# Altium footprint library ref-packages-longpad.PCBLIB: 1527 footprints (part 74 of 103) (continued)
## SQFP-R-28X40-440 [mm] (continued)
Top Overlay:
  circle w0.254: c-17.75,-12 r0.75
  lines w0.203: -19.57,-13.56 19.56,-13.56 19.56,13.56 -19.57,13.56 -19.57,-13.56
Mechanical 16:
  drawing of 444 lines, arcs and shapes, not listed
Mechanical 27:
  lines w0.2: -21.9,-16.4 -21.9,16.4 21.9,16.4 21.9,-16.4 -21.9,-16.4

## SQFP-R-FP05X07-32 [mil]
pads (32):
  rect 11.81x62.99 smd: 1(-88.58,-122.05) 2(-68.9,-122.05) 3(-49.21,-122.05) 4(-29.53,-122.05) 5(-9.84,-122.05) 6(9.84,-122.05) 7(29.53,-122.05) 8(49.21,-122.05) 9(68.9,-122.05) 10(88.58,-122.05) 17(88.58,122.05) 18(68.9,122.05) 19(49.21,122.05) 20(29.53,122.05) 21(9.84,122.05) 22(-9.84,122.05) 23(-29.53,122.05) 24(-49.21,122.05) 25(-68.9,122.05) 26(-88.58,122.05)
  rect 62.99x11.81 smd: 11(161.42,-49.21) 12(161.42,-29.53) 13(161.42,-9.84) 14(161.42,9.84) 15(161.42,29.53) 16(161.42,49.21) 27(-161.42,49.21) 28(-161.42,29.53) 29(-161.42,9.84) 30(-161.42,-9.84) 31(-161.42,-29.53) 32(-161.42,-49.21)
Top Overlay:
  circle w10: c-74.8,-39.37 r29.52
  lines w8: -120.87,-81.1 120.47,-81.1 120.47,81.1 -120.87,81.1 -120.87,-81.1
Mechanical 16:
  rectangle: -94.49,-141.73 -82.68,-96.46
  rectangle: 133.86,-55.12 181.1,-43.31
  rectangle: -74.8,-141.73 -62.99,-96.46
  rectangle: -55.12,-141.73 -43.31,-96.46
  rectangle: -35.43,-141.73 -23.62,-96.46
  rectangle: -15.75,-141.73 -3.94,-96.46
  rectangle: 3.94,-141.73 15.75,-96.46
  rectangle: 23.62,-141.73 35.43,-96.46
  rectangle: 43.31,-141.73 55.12,-96.46
  rectangle: 62.99,-141.73 74.8,-96.46
  rectangle: 82.68,-141.73 94.49,-96.46
  rectangle: 133.86,-35.43 181.1,-23.62
  rectangle: 133.86,-15.75 181.1,-3.94
  rectangle: 133.86,3.94 181.1,15.75
  rectangle: 133.86,23.62 181.1,35.43
  rectangle: 133.86,43.31 181.1,55.12
  rectangle: 82.68,96.46 94.49,141.73
  rectangle: 62.99,96.46 74.8,141.73
  rectangle: 43.31,96.46 55.12,141.73
  rectangle: 23.62,96.46 35.43,141.73
  rectangle: 3.94,96.46 15.75,141.73
  rectangle: -15.75,96.46 -3.94,141.73
  rectangle: -35.43,96.46 -23.62,141.73
  rectangle: -55.12,96.46 -43.31,141.73
  rectangle: -74.8,96.46 -62.99,141.73
  rectangle: -94.49,96.46 -82.68,141.73
  rectangle: -181.1,43.31 -133.86,55.12
  rectangle: -181.1,23.62 -133.86,35.43
  rectangle: -181.1,3.94 -133.86,15.75
  rectangle: -181.1,-15.75 -133.86,-3.94
  rectangle: -181.1,-35.43 -133.86,-23.62
  rectangle: -181.1,-55.12 -133.86,-43.31
  lines w8: -133.86,-94.49 133.86,-94.49 133.86,94.49 -133.86,94.49 -133.86,-94.49
Mechanical 27:
  lines w7.87: -212.6,-173.23 -212.6,173.23 212.6,173.23 212.6,-173.23 -212.6,-173.23

## SQFP-S-5X5-24 [mil]
pads (24):
  rect 11.81x62.99 smd: 1(-49.21,-122.05) 2(-29.53,-122.05) 3(-9.84,-122.05) 4(9.84,-122.05) 5(29.53,-122.05) 6(49.21,-122.05) 13(49.21,122.05) 14(29.53,122.05) 15(9.84,122.05) 16(-9.84,122.05) 17(-29.53,122.05) 18(-49.21,122.05)
  rect 62.99x11.81 smd: 7(122.05,-49.21) 8(122.05,-29.53) 9(122.05,-9.84) 10(122.05,9.84) 11(122.05,29.53) 12(122.05,49.21) 19(-122.05,49.21) 20(-122.05,29.53) 21(-122.05,9.84) 22(-122.05,-9.84) 23(-122.05,-29.53) 24(-122.05,-49.21)
Top Overlay:
  circle w10: c-49.21,-49.21 r19.68
  lines w8: -86.61,-86.61 86.61,-86.61 86.61,86.61 -86.61,86.61 -86.61,-86.61
Mechanical 16:
  rectangle: -55.12,-141.73 -43.31,-96.46
  rectangle: -35.43,-141.73 -23.62,-96.46
  rectangle: -15.75,-141.73 -3.94,-96.46
  rectangle: 3.94,-141.73 15.75,-96.46
  rectangle: 23.62,-141.73 35.43,-96.46
  rectangle: 43.31,-141.73 55.12,-96.46
  rectangle: 96.46,-55.12 141.73,-43.31
  rectangle: 96.46,-35.43 141.73,-23.62
  rectangle: 96.46,-15.75 141.73,-3.94
  rectangle: 96.46,3.94 141.73,15.75
  rectangle: 96.46,23.62 141.73,35.43
  rectangle: 96.46,43.31 141.73,55.12
  rectangle: 43.31,96.46 55.12,141.73
  rectangle: 23.62,96.46 35.43,141.73
  rectangle: 3.94,96.46 15.75,141.73
  rectangle: -15.75,96.46 -3.94,141.73
  rectangle: -35.43,96.46 -23.62,141.73
  rectangle: -55.12,96.46 -43.31,141.73
  rectangle: -141.73,43.31 -96.46,55.12
  rectangle: -141.73,23.62 -96.46,35.43
  rectangle: -141.73,3.94 -96.46,15.75
  rectangle: -141.73,-15.75 -96.46,-3.94
  rectangle: -141.73,-35.43 -96.46,-23.62
  rectangle: -141.73,-55.12 -96.46,-43.31
  lines w8: -94.49,-94.49 94.49,-94.49 94.49,94.49 -94.49,94.49 -94.49,-94.49
Mechanical 27:
  lines w7.87: -173.23,-173.23 -173.23,173.23 173.23,173.23 173.23,-173.23 -173.23,-173.23

## SQFP-S-5X5-32 [mil]
pads (32):
  rect 11.81x62.99 smd: 1(-68.9,-122.05) 2(-49.21,-122.05) 3(-29.53,-122.05) 4(-9.84,-122.05) 5(9.84,-122.05) 6(29.53,-122.05) 7(49.21,-122.05) 8(68.9,-122.05) 17(68.9,122.05) 18(49.21,122.05) 19(29.53,122.05) 20(9.84,122.05) 21(-9.84,122.05) 22(-29.53,122.05) 23(-49.21,122.05) 24(-68.9,122.05)
  rect 62.99x11.81 smd: 9(122.05,-68.9) 10(122.05,-49.21) 11(122.05,-29.53) 12(122.05,-9.84) 13(122.05,9.84) 14(122.05,29.53) 15(122.05,49.21) 16(122.05,68.9) 25(-122.05,68.9) 26(-122.05,49.21) 27(-122.05,29.53) 28(-122.05,9.84) 29(-122.05,-9.84) 30(-122.05,-29.53) 31(-122.05,-49.21) 32(-122.05,-68.9)
Top Overlay:
  circle w10: c-49.21,-49.21 r19.68
  lines w8: -86.61,-86.61 86.61,-86.61 86.61,86.61 -86.61,86.61 -86.61,-86.61
Mechanical 16:
  rectangle: -74.8,-141.73 -62.99,-96.46
  rectangle: -55.12,-141.73 -43.31,-96.46
  rectangle: -35.43,-141.73 -23.62,-96.46
  rectangle: -15.75,-141.73 -3.94,-96.46
  rectangle: 3.94,-141.73 15.75,-96.46
  rectangle: 23.62,-141.73 35.43,-96.46
  rectangle: 43.31,-141.73 55.12,-96.46
  rectangle: 62.99,-141.73 74.8,-96.46
  rectangle: 96.46,-74.8 141.73,-62.99
  rectangle: 96.46,-55.12 141.73,-43.31
  rectangle: 96.46,-35.43 141.73,-23.62
  rectangle: 96.46,-15.75 141.73,-3.94
  rectangle: 96.46,3.94 141.73,15.75
  rectangle: 96.46,23.62 141.73,35.43
  rectangle: 96.46,43.31 141.73,55.12
  rectangle: 96.46,62.99 141.73,74.8
  rectangle: 62.99,96.46 74.8,141.73
  rectangle: 43.31,96.46 55.12,141.73
  rectangle: 23.62,96.46 35.43,141.73
  rectangle: 3.94,96.46 15.75,141.73
  rectangle: -15.75,96.46 -3.94,141.73
  rectangle: -35.43,96.46 -23.62,141.73
  rectangle: -55.12,96.46 -43.31,141.73
  rectangle: -74.8,96.46 -62.99,141.73
  rectangle: -141.73,62.99 -96.46,74.8
  rectangle: -141.73,43.31 -96.46,55.12
  rectangle: -141.73,23.62 -96.46,35.43
  rectangle: -141.73,3.94 -96.46,15.75
  rectangle: -141.73,-15.75 -96.46,-3.94
  rectangle: -141.73,-35.43 -96.46,-23.62
  rectangle: -141.73,-55.12 -96.46,-43.31
  rectangle: -141.73,-74.8 -96.46,-62.99
  lines w8: -94.49,-94.49 94.49,-94.49 94.49,94.49 -94.49,94.49 -94.49,-94.49
Mechanical 27:
  lines w7.87: -173.23,-173.23 -173.23,173.23 173.23,173.23 173.23,-173.23 -173.23,-173.23

## SQFP-S-5X5-32-F [mm]
pads (32):
  rect 0.25x1.6 smd: 1(-1.4,-3.1) 2(-1,-3.1) 3(-0.6,-3.1) 4(-0.2,-3.1) 5(0.2,-3.1) 6(0.6,-3.1) 7(1,-3.1) 8(1.4,-3.1) 17(1.4,3.1) 18(1,3.1) 19(0.6,3.1) 20(0.2,3.1) 21(-0.2,3.1) 22(-0.6,3.1) 23(-1,3.1) 24(-1.4,3.1)
  rect 1.6x0.25 smd: 9(3.1,-1.4) 10(3.1,-1) 11(3.1,-0.6) 12(3.1,-0.2) 13(3.1,0.2) 14(3.1,0.6) 15(3.1,1) 16(3.1,1.4) 25(-3.1,1.4) 26(-3.1,1) 27(-3.1,0.6) 28(-3.1,0.2) 29(-3.1,-0.2) 30(-3.1,-0.6) 31(-3.1,-1) 32(-3.1,-1.4)
Top Overlay:
  circle w0.254: c-1.25,-1.25 r0.5
  lines w0.203: -2.2,-2.2 2.2,-2.2 2.2,2.2 -2.2,2.2 -2.2,-2.2
Mechanical 16:
  rectangle: -1.51,-3.6 -1.29,-2.45
  rectangle: -1.11,-3.6 -0.89,-2.45
  rectangle: -0.71,-3.6 -0.49,-2.45
  rectangle: -0.31,-3.6 -0.09,-2.45
  rectangle: 0.09,-3.6 0.31,-2.45
  rectangle: 0.49,-3.6 0.71,-2.45
  rectangle: 0.89,-3.6 1.11,-2.45
  rectangle: 1.29,-3.6 1.51,-2.45
  rectangle: 2.45,-1.51 3.6,-1.29
  rectangle: 2.45,-1.11 3.6,-0.89
  rectangle: 2.45,-0.71 3.6,-0.49
  rectangle: 2.45,-0.31 3.6,-0.09
  rectangle: 2.45,0.09 3.6,0.31
  rectangle: 2.45,0.49 3.6,0.71
  rectangle: 2.45,0.89 3.6,1.11
  rectangle: 2.45,1.29 3.6,1.51
  rectangle: 1.29,2.45 1.51,3.6
  rectangle: 0.89,2.45 1.11,3.6
  rectangle: 0.49,2.45 0.71,3.6
  rectangle: 0.09,2.45 0.31,3.6
  rectangle: -0.31,2.45 -0.09,3.6
  rectangle: -0.71,2.45 -0.49,3.6
  rectangle: -1.11,2.45 -0.89,3.6
  rectangle: -1.51,2.45 -1.29,3.6
  rectangle: -3.6,1.29 -2.45,1.51
  rectangle: -3.6,0.89 -2.45,1.11
  rectangle: -3.6,0.49 -2.45,0.71
  rectangle: -3.6,0.09 -2.45,0.31
  rectangle: -3.6,-0.31 -2.45,-0.09
  rectangle: -3.6,-0.71 -2.45,-0.49
  rectangle: -3.6,-1.11 -2.45,-0.89
  rectangle: -3.6,-1.51 -2.45,-1.29
  lines w0.203: -2.4,-2.4 2.4,-2.4 2.4,2.4 -2.4,2.4 -2.4,-2.4
Mechanical 27:
  lines w0.2: -4.4,-4.4 -4.4,4.4 4.4,4.4 4.4,-4.4 -4.4,-4.4

## SQFP-S-5X5-40 [mm]
pads (40):
  rect 0.25x1.6 smd: 1(-1.8,-3.1) 2(-1.4,-3.1) 3(-1,-3.1) 4(-0.6,-3.1) 5(-0.2,-3.1) 6(0.2,-3.1) 7(0.6,-3.1) 8(1,-3.1) 9(1.4,-3.1) 10(1.8,-3.1) 21(1.8,3.1) 22(1.4,3.1) 23(1,3.1) 24(0.6,3.1) 25(0.2,3.1) 26(-0.2,3.1) 27(-0.6,3.1) 28(-1,3.1) 29(-1.4,3.1) 30(-1.8,3.1)
  rect 1.6x0.25 smd: 11(3.1,-1.8) 12(3.1,-1.4) 13(3.1,-1) 14(3.1,-0.6) 15(3.1,-0.2) 16(3.1,0.2) 17(3.1,0.6) 18(3.1,1) 19(3.1,1.4) 20(3.1,1.8) 31(-3.1,1.8) 32(-3.1,1.4) 33(-3.1,1) 34(-3.1,0.6) 35(-3.1,0.2) 36(-3.1,-0.2) 37(-3.1,-0.6) 38(-3.1,-1) 39(-3.1,-1.4) 40(-3.1,-1.8)
Top Overlay:
  circle w0.254: c-1.25,-1.25 r0.5
  lines w0.203: -2.2,-2.2 2.2,-2.2 2.2,2.2 -2.2,2.2 -2.2,-2.2
Mechanical 16:
  rectangle: -1.91,-3.6 -1.69,-2.45
  rectangle: -1.51,-3.6 -1.29,-2.45
  rectangle: -1.11,-3.6 -0.89,-2.45
  rectangle: -0.71,-3.6 -0.49,-2.45
  rectangle: -0.31,-3.6 -0.09,-2.45
  rectangle: 0.09,-3.6 0.31,-2.45
  rectangle: 0.49,-3.6 0.71,-2.45
  rectangle: 0.89,-3.6 1.11,-2.45
  rectangle: 1.29,-3.6 1.51,-2.45
  rectangle: 1.69,-3.6 1.91,-2.45
  rectangle: 2.45,-1.91 3.6,-1.69
  rectangle: 2.45,-1.51 3.6,-1.29
  rectangle: 2.45,-1.11 3.6,-0.89
  rectangle: 2.45,-0.71 3.6,-0.49
  rectangle: 2.45,-0.31 3.6,-0.09
  rectangle: 2.45,0.09 3.6,0.31
  rectangle: 2.45,0.49 3.6,0.71
  rectangle: 2.45,0.89 3.6,1.11
  rectangle: 2.45,1.29 3.6,1.51
  rectangle: 2.45,1.69 3.6,1.91
  rectangle: 1.69,2.45 1.91,3.6
  rectangle: 1.29,2.45 1.51,3.6
  rectangle: 0.89,2.45 1.11,3.6
  rectangle: 0.49,2.45 0.71,3.6
  rectangle: 0.09,2.45 0.31,3.6
  rectangle: -0.31,2.45 -0.09,3.6
  rectangle: -0.71,2.45 -0.49,3.6
  rectangle: -1.11,2.45 -0.89,3.6
  rectangle: -1.51,2.45 -1.29,3.6
  rectangle: -1.91,2.45 -1.69,3.6
  rectangle: -3.6,1.69 -2.45,1.91
  rectangle: -3.6,1.29 -2.45,1.51
  rectangle: -3.6,0.89 -2.45,1.11
  rectangle: -3.6,0.49 -2.45,0.71
  rectangle: -3.6,0.09 -2.45,0.31
  rectangle: -3.6,-0.31 -2.45,-0.09
  rectangle: -3.6,-0.71 -2.45,-0.49
  rectangle: -3.6,-1.11 -2.45,-0.89
  rectangle: -3.6,-1.51 -2.45,-1.29
  rectangle: -3.6,-1.91 -2.45,-1.69
  lines w0.203: -2.4,-2.4 2.4,-2.4 2.4,2.4 -2.4,2.4 -2.4,-2.4
Mechanical 27:
  lines w0.2: -4.4,-4.4 -4.4,4.4 4.4,4.4 4.4,-4.4 -4.4,-4.4

## SQFP-S-5X5-48 [mm]
pads (48):
  rect 0.17x1.6 smd: 1(-1.65,-3.1) 2(-1.35,-3.1) 3(-1.05,-3.1) 4(-0.75,-3.1) 5(-0.45,-3.1) 6(-0.15,-3.1) 7(0.15,-3.1) 8(0.45,-3.1) 9(0.75,-3.1) 10(1.05,-3.1) 11(1.35,-3.1) 12(1.65,-3.1) 25(1.65,3.1) 26(1.35,3.1) 27(1.05,3.1) 28(0.75,3.1) 29(0.45,3.1) 30(0.15,3.1) 31(-0.15,3.1) 32(-0.45,3.1) 33(-0.75,3.1) 34(-1.05,3.1) 35(-1.35,3.1) 36(-1.65,3.1)
  rect 1.6x0.17 smd: 13(3.1,-1.65) 14(3.1,-1.35) 15(3.1,-1.05) 16(3.1,-0.75) 17(3.1,-0.45) 18(3.1,-0.15) 19(3.1,0.15) 20(3.1,0.45) 21(3.1,0.75) 22(3.1,1.05) 23(3.1,1.35) 24(3.1,1.65) 37(-3.1,1.65) 38(-3.1,1.35) 39(-3.1,1.05) 40(-3.1,0.75) 41(-3.1,0.45) 42(-3.1,0.15) 43(-3.1,-0.15) 44(-3.1,-0.45) 45(-3.1,-0.75) 46(-3.1,-1.05) 47(-3.1,-1.35) 48(-3.1,-1.65)
Top Overlay:
  circle w0.254: c-1.25,-1.25 r0.5
  lines w0.203: -2.2,-2.2 2.2,-2.2 2.2,2.2 -2.2,2.2 -2.2,-2.2
Mechanical 16:
  rectangle: -1.72,-3.6 -1.58,-2.45
  rectangle: -1.42,-3.6 -1.28,-2.45
  rectangle: -1.12,-3.6 -0.98,-2.45
  rectangle: -0.82,-3.6 -0.68,-2.45
  rectangle: -0.52,-3.6 -0.38,-2.45
  rectangle: -0.22,-3.6 -0.08,-2.45
  rectangle: 0.08,-3.6 0.22,-2.45
  rectangle: 0.38,-3.6 0.52,-2.45
  rectangle: 0.68,-3.6 0.82,-2.45
  rectangle: 0.98,-3.6 1.12,-2.45
  rectangle: 1.28,-3.6 1.42,-2.45
  rectangle: 1.58,-3.6 1.72,-2.45
  rectangle: 2.45,-1.72 3.6,-1.58
  rectangle: 2.45,-1.42 3.6,-1.28
  rectangle: 2.45,-1.12 3.6,-0.98
  rectangle: 2.45,-0.82 3.6,-0.68
  rectangle: 2.45,-0.52 3.6,-0.38
  rectangle: 2.45,-0.22 3.6,-0.08
  rectangle: 2.45,0.08 3.6,0.22
  rectangle: 2.45,0.38 3.6,0.52
  rectangle: 2.45,0.68 3.6,0.82
  rectangle: 2.45,0.98 3.6,1.12
  rectangle: 2.45,1.28 3.6,1.42
  rectangle: 2.45,1.58 3.6,1.72
  rectangle: 1.58,2.45 1.72,3.6
  rectangle: 1.28,2.45 1.42,3.6
  rectangle: 0.98,2.45 1.12,3.6
  rectangle: 0.68,2.45 0.82,3.6
  rectangle: 0.38,2.45 0.52,3.6
  rectangle: 0.08,2.45 0.22,3.6
  rectangle: -0.22,2.45 -0.08,3.6
  rectangle: -0.52,2.45 -0.38,3.6
  rectangle: -0.82,2.45 -0.68,3.6
  rectangle: -1.12,2.45 -0.98,3.6
  rectangle: -1.42,2.45 -1.28,3.6
  rectangle: -1.72,2.45 -1.58,3.6
  rectangle: -3.6,1.58 -2.45,1.72
  rectangle: -3.6,1.28 -2.45,1.42
  rectangle: -3.6,0.98 -2.45,1.12
  rectangle: -3.6,0.68 -2.45,0.82
  rectangle: -3.6,0.38 -2.45,0.52
  rectangle: -3.6,0.08 -2.45,0.22
  rectangle: -3.6,-0.22 -2.45,-0.08
  rectangle: -3.6,-0.52 -2.45,-0.38
  rectangle: -3.6,-0.82 -2.45,-0.68
  rectangle: -3.6,-1.12 -2.45,-0.98
  rectangle: -3.6,-1.42 -2.45,-1.28
  rectangle: -3.6,-1.72 -2.45,-1.58
  lines w0.203: -2.4,-2.4 2.4,-2.4 2.4,2.4 -2.4,2.4 -2.4,-2.4
Mechanical 27:
  lines w0.2: -4.4,-4.4 -4.4,4.4 4.4,4.4 4.4,-4.4 -4.4,-4.4

## SQFP-S-5X5-56 [mm]
pads (56):
  rect 0.17x1.6 smd: 1(-1.95,-3.1) 2(-1.65,-3.1) 3(-1.35,-3.1) 4(-1.05,-3.1) 5(-0.75,-3.1) 6(-0.45,-3.1) 7(-0.15,-3.1) 8(0.15,-3.1) 9(0.45,-3.1) 10(0.75,-3.1) 11(1.05,-3.1) 12(1.35,-3.1) 13(1.65,-3.1) 14(1.95,-3.1) 29(1.95,3.1) 30(1.65,3.1) 31(1.35,3.1) 32(1.05,3.1) 33(0.75,3.1) 34(0.45,3.1) 35(0.15,3.1) 36(-0.15,3.1) 37(-0.45,3.1) 38(-0.75,3.1) 39(-1.05,3.1) 40(-1.35,3.1) 41(-1.65,3.1) 42(-1.95,3.1)
  rect 1.6x0.17 smd: 15(3.1,-1.95) 16(3.1,-1.65) 17(3.1,-1.35) 18(3.1,-1.05) 19(3.1,-0.75) 20(3.1,-0.45) 21(3.1,-0.15) 22(3.1,0.15) 23(3.1,0.45) 24(3.1,0.75) 25(3.1,1.05) 26(3.1,1.35) 27(3.1,1.65) 28(3.1,1.95) 43(-3.1,1.95) 44(-3.1,1.65) 45(-3.1,1.35) 46(-3.1,1.05) 47(-3.1,0.75) 48(-3.1,0.45) 49(-3.1,0.15) 50(-3.1,-0.15) 51(-3.1,-0.45) 52(-3.1,-0.75) 53(-3.1,-1.05) 54(-3.1,-1.35) 55(-3.1,-1.65) 56(-3.1,-1.95)
Top Overlay:
  circle w0.254: c-1.25,-1.25 r0.5
  lines w0.203: -2.2,-2.2 2.2,-2.2 2.2,2.2 -2.2,2.2 -2.2,-2.2
Mechanical 16:
  rectangle: -2.02,-3.6 -1.88,-2.45
  rectangle: -1.72,-3.6 -1.58,-2.45
  rectangle: -1.42,-3.6 -1.28,-2.45
  rectangle: -1.12,-3.6 -0.98,-2.45
  rectangle: -0.82,-3.6 -0.68,-2.45
  rectangle: -0.52,-3.6 -0.38,-2.45
  rectangle: -0.22,-3.6 -0.08,-2.45
  rectangle: 0.08,-3.6 0.22,-2.45
  rectangle: 0.38,-3.6 0.52,-2.45
  rectangle: 0.68,-3.6 0.82,-2.45
  rectangle: 0.98,-3.6 1.12,-2.45
  rectangle: 1.28,-3.6 1.42,-2.45
  rectangle: 1.58,-3.6 1.72,-2.45
  rectangle: 1.88,-3.6 2.02,-2.45
  rectangle: 2.45,-2.02 3.6,-1.88
  rectangle: 2.45,-1.72 3.6,-1.58
  rectangle: 2.45,-1.42 3.6,-1.28
  rectangle: 2.45,-1.12 3.6,-0.98
  rectangle: 2.45,-0.82 3.6,-0.68
  rectangle: 2.45,-0.52 3.6,-0.38
  rectangle: 2.45,-0.22 3.6,-0.08
  rectangle: 2.45,0.08 3.6,0.22
  rectangle: 2.45,0.38 3.6,0.52
  rectangle: 2.45,0.68 3.6,0.82
  rectangle: 2.45,0.98 3.6,1.12
  rectangle: 2.45,1.28 3.6,1.42
  rectangle: 2.45,1.58 3.6,1.72
  rectangle: 2.45,1.88 3.6,2.02
  rectangle: 1.88,2.45 2.02,3.6
  rectangle: 1.58,2.45 1.72,3.6
  rectangle: 1.28,2.45 1.42,3.6
  rectangle: 0.98,2.45 1.12,3.6
  rectangle: 0.68,2.45 0.82,3.6
  rectangle: 0.38,2.45 0.52,3.6
  rectangle: 0.08,2.45 0.22,3.6
  rectangle: -0.22,2.45 -0.08,3.6
  rectangle: -0.52,2.45 -0.38,3.6
  rectangle: -0.82,2.45 -0.68,3.6
  rectangle: -1.12,2.45 -0.98,3.6
  rectangle: -1.42,2.45 -1.28,3.6
  rectangle: -1.72,2.45 -1.58,3.6
  rectangle: -2.02,2.45 -1.88,3.6
  rectangle: -3.6,1.88 -2.45,2.02
  rectangle: -3.6,1.58 -2.45,1.72
  rectangle: -3.6,1.28 -2.45,1.42
  rectangle: -3.6,0.98 -2.45,1.12
  rectangle: -3.6,0.68 -2.45,0.82
  rectangle: -3.6,0.38 -2.45,0.52
  rectangle: -3.6,0.08 -2.45,0.22
  rectangle: -3.6,-0.22 -2.45,-0.08
  rectangle: -3.6,-0.52 -2.45,-0.38
  rectangle: -3.6,-0.82 -2.45,-0.68
  rectangle: -3.6,-1.12 -2.45,-0.98
  rectangle: -3.6,-1.42 -2.45,-1.28
  rectangle: -3.6,-1.72 -2.45,-1.58
  rectangle: -3.6,-2.02 -2.45,-1.88
  lines w0.203: -2.4,-2.4 2.4,-2.4 2.4,2.4 -2.4,2.4 -2.4,-2.4
Mechanical 27:
  lines w0.2: -4.4,-4.4 -4.4,4.4 4.4,4.4 4.4,-4.4 -4.4,-4.4

## SQFP-S-6X6-32 [mil]
pads (32):
  rect 11.81x62.99 smd: 1(-68.9,-141.73) 2(-49.21,-141.73) 3(-29.53,-141.73) 4(-9.84,-141.73) 5(9.84,-141.73) 6(29.53,-141.73) 7(49.21,-141.73) 8(68.9,-141.73) 17(68.9,141.73) 18(49.21,141.73) 19(29.53,141.73) 20(9.84,141.73) 21(-9.84,141.73) 22(-29.53,141.73) 23(-49.21,141.73) 24(-68.9,141.73)
  rect 62.99x11.81 smd: 9(141.73,-68.9) 10(141.73,-49.21) 11(141.73,-29.53) 12(141.73,-9.84) 13(141.73,9.84) 14(141.73,29.53) 15(141.73,49.21) 16(141.73,68.9) 25(-141.73,68.9) 26(-141.73,49.21) 27(-141.73,29.53) 28(-141.73,9.84) 29(-141.73,-9.84) 30(-141.73,-29.53) 31(-141.73,-49.21) 32(-141.73,-68.9)
Top Overlay:
  circle w10: c-68.9,-68.9 r19.69
  lines w8: -106.3,-106.3 106.3,-106.3 106.3,106.3 -106.3,106.3 -106.3,-106.3
Mechanical 16:
  rectangle: -74.8,-161.42 -62.99,-116.14
  rectangle: -55.12,-161.42 -43.31,-116.14
  rectangle: -35.43,-161.42 -23.62,-116.14
  rectangle: -15.75,-161.42 -3.94,-116.14
  rectangle: 3.94,-161.42 15.75,-116.14
  rectangle: 23.62,-161.42 35.43,-116.14
  rectangle: 43.31,-161.42 55.12,-116.14
  rectangle: 62.99,-161.42 74.8,-116.14
  rectangle: 116.14,-74.8 161.42,-62.99
  rectangle: 116.14,-55.12 161.42,-43.31
  rectangle: 116.14,-35.43 161.42,-23.62
  rectangle: 116.14,-15.75 161.42,-3.94
  rectangle: 116.14,3.94 161.42,15.75
  rectangle: 116.14,23.62 161.42,35.43
  rectangle: 116.14,43.31 161.42,55.12
  rectangle: 116.14,62.99 161.42,74.8
  rectangle: 62.99,116.14 74.8,161.42
  rectangle: 43.31,116.14 55.12,161.42
  rectangle: 23.62,116.14 35.43,161.42
  rectangle: 3.94,116.14 15.75,161.42
  rectangle: -15.75,116.14 -3.94,161.42
  rectangle: -35.43,116.14 -23.62,161.42
  rectangle: -55.12,116.14 -43.31,161.42
  rectangle: -74.8,116.14 -62.99,161.42
  rectangle: -161.42,62.99 -116.14,74.8
  rectangle: -161.42,43.31 -116.14,55.12
  rectangle: -161.42,23.62 -116.14,35.43
  rectangle: -161.42,3.94 -116.14,15.75
  rectangle: -161.42,-15.75 -116.14,-3.94
  rectangle: -161.42,-35.43 -116.14,-23.62
  rectangle: -161.42,-55.12 -116.14,-43.31
  rectangle: -161.42,-74.8 -116.14,-62.99
  lines w8: -114.17,-114.17 114.17,-114.17 114.17,114.17 -114.17,114.17 -114.17,-114.17
Mechanical 27:
  lines w7.87: -192.91,-192.91 -192.91,192.91 192.91,192.91 192.91,-192.91 -192.91,-192.91

## SQFP-S-6X6-40 [mil]
pads (40):
  rect 11.81x62.99 smd: 1(-88.58,-141.73) 2(-68.9,-141.73) 3(-49.21,-141.73) 4(-29.53,-141.73) 5(-9.84,-141.73) 6(9.84,-141.73) 7(29.53,-141.73) 8(49.21,-141.73) 9(68.9,-141.73) 10(88.58,-141.73) 21(88.58,141.73) 22(68.9,141.73) 23(49.21,141.73) 24(29.53,141.73) 25(9.84,141.73) 26(-9.84,141.73) 27(-29.53,141.73) 28(-49.21,141.73) 29(-68.9,141.73) 30(-88.58,141.73)
  rect 62.99x11.81 smd: 11(141.73,-88.58) 12(141.73,-68.9) 13(141.73,-49.21) 14(141.73,-29.53) 15(141.73,-9.84) 16(141.73,9.84) 17(141.73,29.53) 18(141.73,49.21) 19(141.73,68.9) 20(141.73,88.58) 31(-141.73,88.58) 32(-141.73,68.9) 33(-141.73,49.21) 34(-141.73,29.53) 35(-141.73,9.84) 36(-141.73,-9.84) 37(-141.73,-29.53) 38(-141.73,-49.21) 39(-141.73,-68.9) 40(-141.73,-88.58)
Top Overlay:
  circle w10: c-68.9,-68.9 r19.69
  lines w8: -106.3,-106.3 106.3,-106.3 106.3,106.3 -106.3,106.3 -106.3,-106.3
Mechanical 16:
  rectangle: -94.49,-161.42 -82.68,-116.14
  rectangle: -74.8,-161.42 -62.99,-116.14
  rectangle: -55.12,-161.42 -43.31,-116.14
  rectangle: -35.43,-161.42 -23.62,-116.14
  rectangle: -15.75,-161.42 -3.94,-116.14
  rectangle: 3.94,-161.42 15.75,-116.14
  rectangle: 23.62,-161.42 35.43,-116.14
  rectangle: 43.31,-161.42 55.12,-116.14
  rectangle: 62.99,-161.42 74.8,-116.14
  rectangle: 82.68,-161.42 94.49,-116.14
  rectangle: 116.14,-94.49 161.42,-82.68
  rectangle: 116.14,-74.8 161.42,-62.99
  rectangle: 116.14,-55.12 161.42,-43.31
  rectangle: 116.14,-35.43 161.42,-23.62
  rectangle: 116.14,-15.75 161.42,-3.94
  rectangle: 116.14,3.94 161.42,15.75
  rectangle: 116.14,23.62 161.42,35.43
  rectangle: 116.14,43.31 161.42,55.12
  rectangle: 116.14,62.99 161.42,74.8
  rectangle: 116.14,82.68 161.42,94.49
  rectangle: 82.68,116.14 94.49,161.42
  rectangle: 62.99,116.14 74.8,161.42
  rectangle: 43.31,116.14 55.12,161.42
  rectangle: 23.62,116.14 35.43,161.42
  rectangle: 3.94,116.14 15.75,161.42
  rectangle: -15.75,116.14 -3.94,161.42
  rectangle: -35.43,116.14 -23.62,161.42
  rectangle: -55.12,116.14 -43.31,161.42
  rectangle: -74.8,116.14 -62.99,161.42
  rectangle: -94.49,116.14 -82.68,161.42
  rectangle: -161.42,82.68 -116.14,94.49
  rectangle: -161.42,62.99 -116.14,74.8
  rectangle: -161.42,43.31 -116.14,55.12
  rectangle: -161.42,23.62 -116.14,35.43
  rectangle: -161.42,3.94 -116.14,15.75
  rectangle: -161.42,-15.75 -116.14,-3.94
  rectangle: -161.42,-35.43 -116.14,-23.62
  rectangle: -161.42,-55.12 -116.14,-43.31
  rectangle: -161.42,-74.8 -116.14,-62.99
  rectangle: -161.42,-94.49 -116.14,-82.68
  lines w8: -114.17,-114.17 114.17,-114.17 114.17,114.17 -114.17,114.17 -114.17,-114.17
Mechanical 27:
  lines w7.87: -212.6,-192.91 -212.6,192.91 192.91,192.91 192.91,-192.91 -212.6,-192.91

## SQFP-S-6X6-40-F [mm]
pads (40):
  rect 0.25x1.6 smd: 1(-1.8,-3.6) 2(-1.4,-3.6) 3(-1,-3.6) 4(-0.6,-3.6) 5(-0.2,-3.6) 6(0.2,-3.6) 7(0.6,-3.6) 8(1,-3.6) 9(1.4,-3.6) 10(1.8,-3.6) 21(1.8,3.6) 22(1.4,3.6) 23(1,3.6) 24(0.6,3.6) 25(0.2,3.6) 26(-0.2,3.6) 27(-0.6,3.6) 28(-1,3.6) 29(-1.4,3.6) 30(-1.8,3.6)
  rect 1.6x0.25 smd: 11(3.6,-1.8) 12(3.6,-1.4) 13(3.6,-1) 14(3.6,-0.6) 15(3.6,-0.2) 16(3.6,0.2) 17(3.6,0.6) 18(3.6,1) 19(3.6,1.4) 20(3.6,1.8) 31(-3.6,1.8) 32(-3.6,1.4) 33(-3.6,1) 34(-3.6,0.6) 35(-3.6,0.2) 36(-3.6,-0.2) 37(-3.6,-0.6) 38(-3.6,-1) 39(-3.6,-1.4) 40(-3.6,-1.8)
Top Overlay:
  circle w0.254: c-1.75,-1.75 r0.5
  lines w0.203: -2.7,-2.7 2.7,-2.7 2.7,2.7 -2.7,2.7 -2.7,-2.7
Mechanical 16:
  rectangle: -1.91,-4.1 -1.69,-2.95
  rectangle: -1.51,-4.1 -1.29,-2.95
  rectangle: -1.11,-4.1 -0.89,-2.95
  rectangle: -0.71,-4.1 -0.49,-2.95
  rectangle: -0.31,-4.1 -0.09,-2.95
  rectangle: 0.09,-4.1 0.31,-2.95
  rectangle: 0.49,-4.1 0.71,-2.95
  rectangle: 0.89,-4.1 1.11,-2.95
  rectangle: 1.29,-4.1 1.51,-2.95
  rectangle: 1.69,-4.1 1.91,-2.95
  rectangle: 2.95,-1.91 4.1,-1.69
  rectangle: 2.95,-1.51 4.1,-1.29
  rectangle: 2.95,-1.11 4.1,-0.89
  rectangle: 2.95,-0.71 4.1,-0.49
  rectangle: 2.95,-0.31 4.1,-0.09
  rectangle: 2.95,0.09 4.1,0.31
  rectangle: 2.95,0.49 4.1,0.71
  rectangle: 2.95,0.89 4.1,1.11
  rectangle: 2.95,1.29 4.1,1.51
  rectangle: 2.95,1.69 4.1,1.91
  rectangle: 1.69,2.95 1.91,4.1
  rectangle: 1.29,2.95 1.51,4.1
  rectangle: 0.89,2.95 1.11,4.1
  rectangle: 0.49,2.95 0.71,4.1
  rectangle: 0.09,2.95 0.31,4.1
  rectangle: -0.31,2.95 -0.09,4.1
  rectangle: -0.71,2.95 -0.49,4.1
  rectangle: -1.11,2.95 -0.89,4.1
  rectangle: -1.51,2.95 -1.29,4.1
  rectangle: -1.91,2.95 -1.69,4.1
  rectangle: -4.1,1.69 -2.95,1.91
  rectangle: -4.1,1.29 -2.95,1.51
  rectangle: -4.1,0.89 -2.95,1.11
  rectangle: -4.1,0.49 -2.95,0.71
  rectangle: -4.1,0.09 -2.95,0.31
  rectangle: -4.1,-0.31 -2.95,-0.09
  rectangle: -4.1,-0.71 -2.95,-0.49
  rectangle: -4.1,-1.11 -2.95,-0.89
  rectangle: -4.1,-1.51 -2.95,-1.29
  rectangle: -4.1,-1.91 -2.95,-1.69
  lines w0.203: -2.9,-2.9 2.9,-2.9 2.9,2.9 -2.9,2.9 -2.9,-2.9
Mechanical 27:
  lines w0.2: -4.9,-4.9 -4.9,4.9 4.9,4.9 4.9,-4.9 -4.9,-4.9